# Altium schematic symbol library jlcpcb_2025_04_ferrites_extended_0603.schlib: 833 symbols (part 2 of 4) (continued)
## FBMH1608HM102-T (continued)
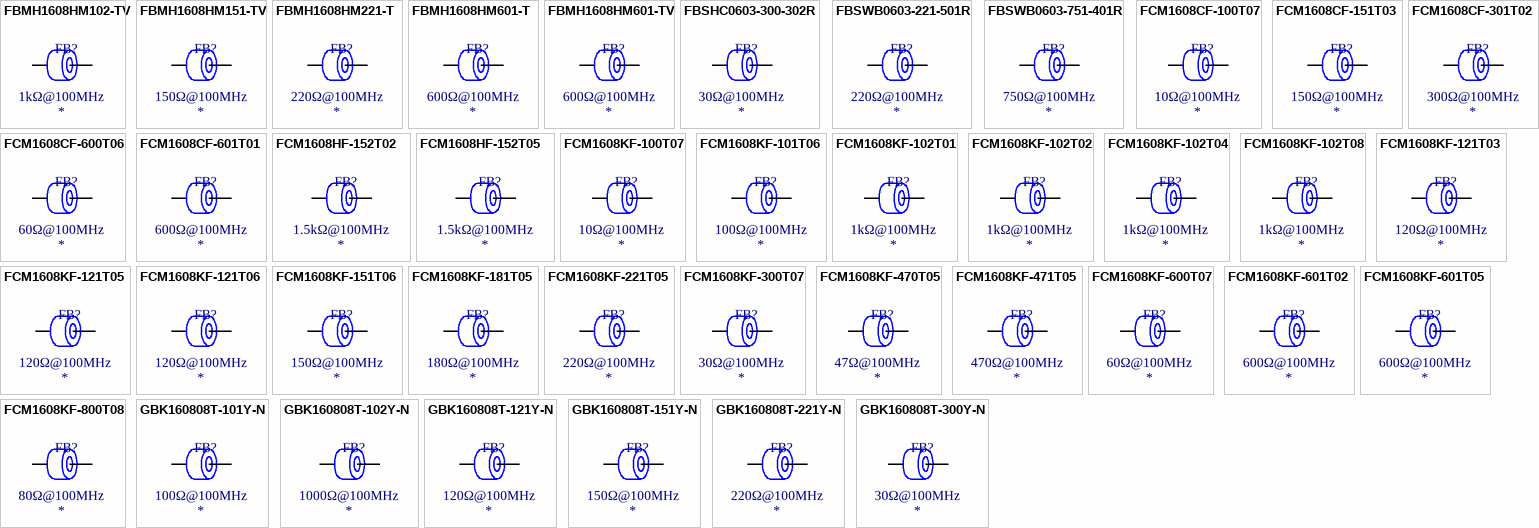
[diagram p9: symbols FBMH1608HM102-TV to GBK160808T-300Y-N]

## FBMH1608HM102-TV
designator FB?  Impedance @ Frequency: 1kΩ@100MHz
Ferrite, 1kΩ@100MHz, ±25%, 350mΩ, 0.6A, SMD 0603; Manufacturer: Taiyo Yuden; Manufacturer Part Number: FBMH1608HM102-TV; Package Size: 0603; JLCPCB Basic Part: No; JLCPCB Part Number: C2661514; Supplier 1: LCSC; Category: Ferrite Beads; Supplier Part Number 1: C2661514; Tolerance: ±25%; Rated Current: 0.6A; DC Resistance: 350mΩ; RoHS: Yes; ComponentLink1Description: Datasheet; ComponentLink1URL: https://wmsc.lcsc.com/wmsc/upload/file/pdf/v2/lcsc/2309051427_Taiyo-Yuden-FBMH1608HM102-TV_C2661514.pdf; ComponentLink2Description: JLCPCB Part URL; ComponentLink2URL: https://jlcpcb.com/partdetail/C2661514; ComponentLink3Description: LCSC Part URL; ComponentLink3URL: https://lcsc.com/product-detail/Ferrite-Beads_Taiyo-Yuden-Taiyo-Yuden-FBMH1608HM102-TV_C2661514.html
footprint FB-0603 (0603 (1608M) Ferrite)
pins: 1, 2

## FBMH1608HM151-TV
designator FB?  Impedance @ Frequency: 150Ω@100MHz
Ferrite, 150Ω@100MHz, ±25%, 50mΩ, 2.1A, SMD 0603; Manufacturer: Taiyo Yuden; Manufacturer Part Number: FBMH1608HM151-TV; Package Size: 0603; JLCPCB Basic Part: No; JLCPCB Part Number: C2661725; Supplier 1: LCSC; Category: Ferrite Beads; Supplier Part Number 1: C2661725; Tolerance: ±25%; Rated Current: 2.1A; DC Resistance: 50mΩ; RoHS: Yes; ComponentLink1Description: Datasheet; ComponentLink1URL: https://wmsc.lcsc.com/wmsc/upload/file/pdf/v2/lcsc/2309051427_Taiyo-Yuden-FBMH1608HM151-TV_C2661725.pdf; ComponentLink2Description: JLCPCB Part URL; ComponentLink2URL: https://jlcpcb.com/partdetail/C2661725; ComponentLink3Description: LCSC Part URL; ComponentLink3URL: https://lcsc.com/product-detail/Ferrite-Beads_Taiyo-Yuden-Taiyo-Yuden-FBMH1608HM151-TV_C2661725.html
footprint FB-0603 (0603 (1608M) Ferrite)
pins: 1, 2

## FBMH1608HM221-T
designator FB?  Impedance @ Frequency: 220Ω@100MHz
Ferrite, 220Ω@100MHz, ±25%, 70mΩ, 1.8A, SMD 0603; Manufacturer: Taiyo Yuden; Manufacturer Part Number: FBMH1608HM221-T; Package Size: 0603; JLCPCB Basic Part: No; JLCPCB Part Number: C515367; Supplier 1: LCSC; Category: Ferrite Beads; Supplier Part Number 1: C515367; Tolerance: ±25%; Rated Current: 1.8A; DC Resistance: 70mΩ; RoHS: Yes; ComponentLink1Description: Datasheet; ComponentLink1URL: https://wmsc.lcsc.com/wmsc/upload/file/pdf/v2/lcsc/2008042203_Taiyo-Yuden-FBMH1608HM221-T_C515367.pdf; ComponentLink2Description: JLCPCB Part URL; ComponentLink2URL: https://jlcpcb.com/partdetail/C515367; ComponentLink3Description: LCSC Part URL; ComponentLink3URL: https://lcsc.com/product-detail/Ferrite-Beads_Taiyo-Yuden-Taiyo-Yuden-FBMH1608HM221-T_C515367.html
footprint FB-0603 (0603 (1608M) Ferrite)
pins: 1, 2

## FBMH1608HM601-T
designator FB?  Impedance @ Frequency: 600Ω@100MHz
Ferrite, 600Ω@100MHz, ±25%, 170mΩ, 900mA, SMD 0603; Manufacturer: Taiyo Yuden; Manufacturer Part Number: FBMH1608HM601-T; Package Size: 0603; JLCPCB Basic Part: No; JLCPCB Part Number: C2650950; Supplier 1: LCSC; Category: Ferrite Beads; Supplier Part Number 1: C2650950; Tolerance: ±25%; Rated Current: 900mA; DC Resistance: 170mΩ; RoHS: Yes; ComponentLink1Description: Datasheet; ComponentLink1URL: https://wmsc.lcsc.com/wmsc/upload/file/pdf/v2/lcsc/2309051352_Taiyo-Yuden-FBMH1608HM601-T_C2650950.pdf; ComponentLink2Description: JLCPCB Part URL; ComponentLink2URL: https://jlcpcb.com/partdetail/C2650950; ComponentLink3Description: LCSC Part URL; ComponentLink3URL: https://lcsc.com/product-detail/Ferrite-Beads_Taiyo-Yuden-Taiyo-Yuden-FBMH1608HM601-T_C2650950.html
footprint FB-0603 (0603 (1608M) Ferrite)
pins: 1, 2

## FBMH1608HM601-TV
designator FB?  Impedance @ Frequency: 600Ω@100MHz
Ferrite, 600Ω@100MHz, ±25%, 170mΩ, 900mA, SMD 0603; Manufacturer: Taiyo Yuden; Manufacturer Part Number: FBMH1608HM601-TV; Package Size: 0603; JLCPCB Basic Part: No; JLCPCB Part Number: C515368; Supplier 1: LCSC; Category: Ferrite Beads; Supplier Part Number 1: C515368; Tolerance: ±25%; Rated Current: 900mA; DC Resistance: 170mΩ; RoHS: Yes; ComponentLink1Description: Datasheet; ComponentLink1URL: https://wmsc.lcsc.com/wmsc/upload/file/pdf/v2/lcsc/2304140030_Taiyo-Yuden-FBMH1608HM601-TV_C515368.pdf; ComponentLink2Description: JLCPCB Part URL; ComponentLink2URL: https://jlcpcb.com/partdetail/C515368; ComponentLink3Description: LCSC Part URL; ComponentLink3URL: https://lcsc.com/product-detail/Ferrite-Beads_Taiyo-Yuden-Taiyo-Yuden-FBMH1608HM601-TV_C515368.html
footprint FB-0603 (0603 (1608M) Ferrite)
pins: 1, 2

## FBSHC0603-300-302R
designator FB?  Impedance @ Frequency: 30Ω@100MHz
Ferrite, 30Ω@100MHz, ±25%, 0.04Ω, 3A, SMD 0603; Manufacturer: KOHERelec; Manufacturer Part Number: FBSHC0603-300-302R; Package Size: 0603; JLCPCB Basic Part: No; JLCPCB Part Number: C2922547; Supplier 1: LCSC; Category: Ferrite Beads; Supplier Part Number 1: C2922547; Tolerance: ±25%; Rated Current: 3A; DC Resistance: 0.04Ω; RoHS: Yes; ComponentLink1Description: Datasheet; ComponentLink1URL: https://wmsc.lcsc.com/wmsc/upload/file/pdf/v2/lcsc/2201121300_KOHERelec-FBSHC0603-300-302R_C2922547.pdf; ComponentLink2Description: JLCPCB Part URL; ComponentLink2URL: https://jlcpcb.com/partdetail/C2922547; ComponentLink3Description: LCSC Part URL; ComponentLink3URL: https://lcsc.com/product-detail/Ferrite-Beads_KOHERelec-KOHERelec-FBSHC0603-300-302R_C2922547.html
footprint FB-0603 (0603 (1608M) Ferrite)
pins: 1, 2

## FBSWB0603-221-501R
designator FB?  Impedance @ Frequency: 220Ω@100MHz
Ferrite, 220Ω@100MHz, ±25%, 170mΩ, 500mA, SMD 0603; Manufacturer: KOHERelec; Manufacturer Part Number: FBSWB0603-221-501R; Package Size: 0603; JLCPCB Basic Part: No; JLCPCB Part Number: C2922551; Supplier 1: LCSC; Category: Ferrite Beads; Supplier Part Number 1: C2922551; Tolerance: ±25%; Rated Current: 500mA; DC Resistance: 170mΩ; RoHS: Yes; ComponentLink1Description: Datasheet; ComponentLink1URL: https://wmsc.lcsc.com/wmsc/upload/file/pdf/v2/lcsc/2201121300_KOHERelec-FBSWB0603-221-501R_C2922551.pdf; ComponentLink2Description: JLCPCB Part URL; ComponentLink2URL: https://jlcpcb.com/partdetail/C2922551; ComponentLink3Description: LCSC Part URL; ComponentLink3URL: https://lcsc.com/product-detail/Ferrite-Beads_KOHERelec-KOHERelec-FBSWB0603-221-501R_C2922551.html
footprint FB-0603 (0603 (1608M) Ferrite)
pins: 1, 2

## FBSWB0603-751-401R
designator FB?  Impedance @ Frequency: 750Ω@100MHz
Ferrite, 750Ω@100MHz, ±25%, 350mΩ, 400mA, SMD 0603; Manufacturer: KOHERelec; Manufacturer Part Number: FBSWB0603-751-401R; Package Size: 0603; JLCPCB Basic Part: No; JLCPCB Part Number: C2922549; Supplier 1: LCSC; Category: Ferrite Beads; Supplier Part Number 1: C2922549; Tolerance: ±25%; Rated Current: 400mA; DC Resistance: 350mΩ; RoHS: Yes; ComponentLink1Description: Datasheet; ComponentLink1URL: https://wmsc.lcsc.com/wmsc/upload/file/pdf/v2/lcsc/2201121300_KOHERelec-FBSWB0603-751-401R_C2922549.pdf; ComponentLink2Description: JLCPCB Part URL; ComponentLink2URL: https://jlcpcb.com/partdetail/C2922549; ComponentLink3Description: LCSC Part URL; ComponentLink3URL: https://lcsc.com/product-detail/Ferrite-Beads_KOHERelec-KOHERelec-FBSWB0603-751-401R_C2922549.html
footprint FB-0603 (0603 (1608M) Ferrite)
pins: 1, 2

## FCM1608CF-100T07
designator FB?  Impedance @ Frequency: 10Ω@100MHz
Ferrite, 10Ω@100MHz, ±25%, 200mΩ, 700mA, SMD 0603; Manufacturer: TAI-TECH; Manufacturer Part Number: FCM1608CF-100T07; Package Size: 0603; JLCPCB Basic Part: No; JLCPCB Part Number: C155053; Supplier 1: LCSC; Category: Ferrite Beads; Supplier Part Number 1: C155053; Tolerance: ±25%; Rated Current: 700mA; DC Resistance: 200mΩ; RoHS: Yes; ComponentLink1Description: Datasheet; ComponentLink1URL: https://wmsc.lcsc.com/wmsc/upload/file/pdf/v2/lcsc/2009171306_TAI-TECH-FCM1608CF-100T07_C155053.pdf; ComponentLink2Description: JLCPCB Part URL; ComponentLink2URL: https://jlcpcb.com/partdetail/C155053; ComponentLink3Description: LCSC Part URL; ComponentLink3URL: https://lcsc.com/product-detail/Ferrite-Beads_TAI-TECH-TAI-TECH-FCM1608CF-100T07_C155053.html
footprint FB-0603 (0603 (1608M) Ferrite)
pins: 1, 2

## FCM1608CF-151T03
designator FB?  Impedance @ Frequency: 150Ω@100MHz
Ferrite, 150Ω@100MHz, ±25%, 300mA, SMD 0603; Manufacturer: TAI-TECH; Manufacturer Part Number: FCM1608CF-151T03; Package Size: 0603; JLCPCB Basic Part: No; JLCPCB Part Number: C155055; Supplier 1: LCSC; Category: Ferrite Beads; Supplier Part Number 1: C155055; Tolerance: ±25%; Rated Current: 300mA; RoHS: Yes; ComponentLink1Description: Datasheet; ComponentLink1URL: https://wmsc.lcsc.com/wmsc/upload/file/pdf/v2/lcsc/2009171306_TAI-TECH-FCM1608CF-151T03_C155055.pdf; ComponentLink2Description: JLCPCB Part URL; ComponentLink2URL: https://jlcpcb.com/partdetail/C155055; ComponentLink3Description: LCSC Part URL; ComponentLink3URL: https://lcsc.com/product-detail/Ferrite-Beads_TAI-TECH-TAI-TECH-FCM1608CF-151T03_C155055.html
pins: 1, 2

## FCM1608CF-301T02
designator FB?  Impedance @ Frequency: 300Ω@100MHz
Ferrite, 300Ω@100MHz, ±25%, 800mΩ, 200mA, SMD 0603; Manufacturer: TAI-TECH; Manufacturer Part Number: FCM1608CF-301T02; Package Size: 0603; JLCPCB Basic Part: No; JLCPCB Part Number: C155058; Supplier 1: LCSC; Category: Ferrite Beads; Supplier Part Number 1: C155058; Tolerance: ±25%; Rated Current: 200mA; DC Resistance: 800mΩ; RoHS: Yes; ComponentLink1Description: Datasheet; ComponentLink1URL: https://wmsc.lcsc.com/wmsc/upload/file/pdf/v2/lcsc/2009171306_TAI-TECH-FCM1608CF-301T02_C155058.pdf; ComponentLink2Description: JLCPCB Part URL; ComponentLink2URL: https://jlcpcb.com/partdetail/C155058; ComponentLink3Description: LCSC Part URL; ComponentLink3URL: https://lcsc.com/product-detail/Ferrite-Beads_TAI-TECH-TAI-TECH-FCM1608CF-301T02_C155058.html
footprint FB-0603 (0603 (1608M) Ferrite)
pins: 1, 2

## FCM1608CF-600T06
designator FB?  Impedance @ Frequency: 60Ω@100MHz
Ferrite, 60Ω@100MHz, ±25%, 300mΩ, 600mA, SMD 0603; Manufacturer: TAI-TECH; Manufacturer Part Number: FCM1608CF-600T06; Package Size: 0603; JLCPCB Basic Part: No; JLCPCB Part Number: C155060; Supplier 1: LCSC; Category: Ferrite Beads; Supplier Part Number 1: C155060; Tolerance: ±25%; Rated Current: 600mA; DC Resistance: 300mΩ; RoHS: Yes; ComponentLink1Description: Datasheet; ComponentLink1URL: https://wmsc.lcsc.com/wmsc/upload/file/pdf/v2/lcsc/2009171306_TAI-TECH-FCM1608CF-600T06_C155060.pdf; ComponentLink2Description: JLCPCB Part URL; ComponentLink2URL: https://jlcpcb.com/partdetail/C155060; ComponentLink3Description: LCSC Part URL; ComponentLink3URL: https://lcsc.com/product-detail/Ferrite-Beads_TAI-TECH-TAI-TECH-FCM1608CF-600T06_C155060.html
footprint FB-0603 (0603 (1608M) Ferrite)
pins: 1, 2

## FCM1608CF-601T01
designator FB?  Impedance @ Frequency: 600Ω@100MHz
Ferrite, 600Ω@100MHz, ±25%, 1.2Ω, 150mA, SMD 0603; Manufacturer: TAI-TECH; Manufacturer Part Number: FCM1608CF-601T01; Package Size: 0603; JLCPCB Basic Part: No; JLCPCB Part Number: C155061; Supplier 1: LCSC; Category: Ferrite Beads; Supplier Part Number 1: C155061; Tolerance: ±25%; Rated Current: 150mA; DC Resistance: 1.2Ω; RoHS: Yes; ComponentLink1Description: Datasheet; ComponentLink1URL: https://wmsc.lcsc.com/wmsc/upload/file/pdf/v2/lcsc/2009171306_TAI-TECH-FCM1608CF-601T01_C155061.pdf; ComponentLink2Description: JLCPCB Part URL; ComponentLink2URL: https://jlcpcb.com/partdetail/C155061; ComponentLink3Description: LCSC Part URL; ComponentLink3URL: https://lcsc.com/product-detail/Ferrite-Beads_TAI-TECH-TAI-TECH-FCM1608CF-601T01_C155061.html
footprint FB-0603 (0603 (1608M) Ferrite)
pins: 1, 2

## FCM1608HF-152T02
designator FB?  Impedance @ Frequency: 1.5kΩ@100MHz
Ferrite, 1.5kΩ@100MHz, ±25%, 1Ω, 200mA, SMD 0603; Manufacturer: TAI-TECH; Manufacturer Part Number: FCM1608HF-152T02; Package Size: 0603; JLCPCB Basic Part: No; JLCPCB Part Number: C155062; Supplier 1: LCSC; Category: Ferrite Beads; Supplier Part Number 1: C155062; Tolerance: ±25%; Rated Current: 200mA; DC Resistance: 1Ω; RoHS: Yes; ComponentLink1Description: Datasheet; ComponentLink1URL: https://wmsc.lcsc.com/wmsc/upload/file/pdf/v2/lcsc/2009171306_TAI-TECH-FCM1608HF-152T02_C155062.pdf; ComponentLink2Description: JLCPCB Part URL; ComponentLink2URL: https://jlcpcb.com/partdetail/C155062; ComponentLink3Description: LCSC Part URL; ComponentLink3URL: https://lcsc.com/product-detail/Ferrite-Beads_TAI-TECH-TAI-TECH-FCM1608HF-152T02_C155062.html
footprint FB-0603 (0603 (1608M) Ferrite)
pins: 1, 2

## FCM1608HF-152T05
designator FB?  Impedance @ Frequency: 1.5kΩ@100MHz
Ferrite, 1.5kΩ@100MHz, ±25%, 1Ω, 500mA, SMD 0603; Manufacturer: TAI-TECH; Manufacturer Part Number: FCM1608HF-152T05; Package Size: 0603; JLCPCB Basic Part: No; JLCPCB Part Number: C304247; Supplier 1: LCSC; Category: Ferrite Beads; Supplier Part Number 1: C304247; Tolerance: ±25%; Rated Current: 500mA; DC Resistance: 1Ω; RoHS: Yes; ComponentLink1Description: Datasheet; ComponentLink1URL: https://wmsc.lcsc.com/wmsc/upload/file/pdf/v2/lcsc/2009171410_TAI-TECH-FCM1608HF-152T05_C304247.pdf; ComponentLink2Description: JLCPCB Part URL; ComponentLink2URL: https://jlcpcb.com/partdetail/C304247; ComponentLink3Description: LCSC Part URL; ComponentLink3URL: https://lcsc.com/product-detail/Ferrite-Beads_TAI-TECH-TAI-TECH-FCM1608HF-152T05_C304247.html
footprint FB-0603 (0603 (1608M) Ferrite)
pins: 1, 2

## FCM1608KF-100T07
designator FB?  Impedance @ Frequency: 10Ω@100MHz
Ferrite, 10Ω@100MHz, ±25%, 200mΩ, 700mA, SMD 0603; Manufacturer: TAI-TECH; Manufacturer Part Number: FCM1608KF-100T07; Package Size: 0603; JLCPCB Basic Part: No; JLCPCB Part Number: C369538; Supplier 1: LCSC; Category: Ferrite Beads; Supplier Part Number 1: C369538; Tolerance: ±25%; Rated Current: 700mA; DC Resistance: 200mΩ; RoHS: Yes; ComponentLink1Description: Datasheet; ComponentLink1URL: https://wmsc.lcsc.com/wmsc/upload/file/pdf/v2/lcsc/2009171441_TAI-TECH-FCM1608KF-100T07_C369538.pdf; ComponentLink2Description: JLCPCB Part URL; ComponentLink2URL: https://jlcpcb.com/partdetail/C369538; ComponentLink3Description: LCSC Part URL; ComponentLink3URL: https://lcsc.com/product-detail/Ferrite-Beads_TAI-TECH-TAI-TECH-FCM1608KF-100T07_C369538.html
footprint FB-0603 (0603 (1608M) Ferrite)
pins: 1, 2

## FCM1608KF-101T06
designator FB?  Impedance @ Frequency: 100Ω@100MHz
Ferrite, 100Ω@100MHz, ±25%, 250mΩ, 600mA, SMD 0603; Manufacturer: TAI-TECH; Manufacturer Part Number: FCM1608KF-101T06; Package Size: 0603; JLCPCB Basic Part: No; JLCPCB Part Number: C369539; Supplier 1: LCSC; Category: Ferrite Beads; Supplier Part Number 1: C369539; Tolerance: ±25%; Rated Current: 600mA; DC Resistance: 250mΩ; RoHS: Yes; ComponentLink1Description: Datasheet; ComponentLink1URL: https://wmsc.lcsc.com/wmsc/upload/file/pdf/v2/lcsc/2009171441_TAI-TECH-FCM1608KF-101T06_C369539.pdf; ComponentLink2Description: JLCPCB Part URL; ComponentLink2URL: https://jlcpcb.com/partdetail/C369539; ComponentLink3Description: LCSC Part URL; ComponentLink3URL: https://lcsc.com/product-detail/Ferrite-Beads_TAI-TECH-TAI-TECH-FCM1608KF-101T06_C369539.html
footprint FB-0603 (0603 (1608M) Ferrite)
pins: 1, 2

## FCM1608KF-102T01
designator FB?  Impedance @ Frequency: 1kΩ@100MHz
Ferrite, 1kΩ@100MHz, ±25%, 700mΩ, 100mA, SMD 0603; Manufacturer: TAI-TECH; Manufacturer Part Number: FCM1608KF-102T01; Package Size: 0603; JLCPCB Basic Part: No; JLCPCB Part Number: C525669; Supplier 1: LCSC; Category: Ferrite Beads; Supplier Part Number 1: C525669; Tolerance: ±25%; Rated Current: 100mA; DC Resistance: 700mΩ; RoHS: Yes; ComponentLink1Description: Datasheet; ComponentLink1URL: https://wmsc.lcsc.com/wmsc/upload/file/pdf/v2/lcsc/2009171442_TAI-TECH-FCM1608KF-102T01_C525669.pdf; ComponentLink2Description: JLCPCB Part URL; ComponentLink2URL: https://jlcpcb.com/partdetail/C525669; ComponentLink3Description: LCSC Part URL; ComponentLink3URL: https://lcsc.com/product-detail/Ferrite-Beads_TAI-TECH-TAI-TECH-FCM1608KF-102T01_C525669.html
footprint FB-0603 (0603 (1608M) Ferrite)
pins: 1, 2

## FCM1608KF-102T02
designator FB?  Impedance @ Frequency: 1kΩ@100MHz
Ferrite, 1kΩ@100MHz, ±25%, 700mΩ, 200mA, SMD 0603; Manufacturer: TAI-TECH; Manufacturer Part Number: FCM1608KF-102T02; Package Size: 0603; JLCPCB Basic Part: No; JLCPCB Part Number: C127293; Supplier 1: LCSC; Category: Ferrite Beads; Supplier Part Number 1: C127293; Tolerance: ±25%; Rated Current: 200mA; DC Resistance: 700mΩ; RoHS: Yes; ComponentLink1Description: Datasheet; ComponentLink1URL: https://wmsc.lcsc.com/wmsc/upload/file/pdf/v2/lcsc/2009171134_TAI-TECH-FCM1608KF-102T02_C127293.pdf; ComponentLink2Description: JLCPCB Part URL; ComponentLink2URL: https://jlcpcb.com/partdetail/C127293; ComponentLink3Description: LCSC Part URL; ComponentLink3URL: https://lcsc.com/product-detail/Ferrite-Beads_TAI-TECH-TAI-TECH-FCM1608KF-102T02_C127293.html
footprint FB-0603 (0603 (1608M) Ferrite)
pins: 1, 2

## FCM1608KF-102T04
designator FB?  Impedance @ Frequency: 1kΩ@100MHz
Ferrite, 1kΩ@100MHz, ±25%, 700mΩ, 400mA, SMD 0603; Manufacturer: TAI-TECH; Manufacturer Part Number: FCM1608KF-102T04; Package Size: 0603; JLCPCB Basic Part: No; JLCPCB Part Number: C369540; Supplier 1: LCSC; Category: Ferrite Beads; Supplier Part Number 1: C369540; Tolerance: ±25%; Rated Current: 400mA; DC Resistance: 700mΩ; RoHS: Yes; ComponentLink1Description: Datasheet; ComponentLink1URL: https://wmsc.lcsc.com/wmsc/upload/file/pdf/v2/lcsc/2009171442_TAI-TECH-FCM1608KF-102T04_C369540.pdf; ComponentLink2Description: JLCPCB Part URL; ComponentLink2URL: https://jlcpcb.com/partdetail/C369540; ComponentLink3Description: LCSC Part URL; ComponentLink3URL: https://lcsc.com/product-detail/Ferrite-Beads_TAI-TECH-TAI-TECH-FCM1608KF-102T04_C369540.html
footprint FB-0603 (0603 (1608M) Ferrite)
pins: 1, 2

## FCM1608KF-102T08
designator FB?  Impedance @ Frequency: 1kΩ@100MHz
Ferrite, 1kΩ@100MHz, ±25%, 700mΩ, 800mA, SMD 0603; Manufacturer: TAI-TECH; Manufacturer Part Number: FCM1608KF-102T08; Package Size: 0603; JLCPCB Basic Part: No; JLCPCB Part Number: C2880084; Supplier 1: LCSC; Category: Ferrite Beads; Supplier Part Number 1: C2880084; Tolerance: ±25%; Rated Current: 800mA; DC Resistance: 700mΩ; RoHS: Yes; ComponentLink1Description: Datasheet; ComponentLink1URL: https://wmsc.lcsc.com/wmsc/upload/file/pdf/v2/lcsc/2108241130_TAI-TECH-FCM1608KF-102T08_C2880084.pdf; ComponentLink2Description: JLCPCB Part URL; ComponentLink2URL: https://jlcpcb.com/partdetail/C2880084; ComponentLink3Description: LCSC Part URL; ComponentLink3URL: https://lcsc.com/product-detail/Ferrite-Beads_TAI-TECH-TAI-TECH-FCM1608KF-102T08_C2880084.html
footprint FB-0603 (0603 (1608M) Ferrite)
pins: 1, 2

## FCM1608KF-121T03
designator FB?  Impedance @ Frequency: 120Ω@100MHz
Ferrite, 120Ω@100MHz, ±25%, 250mΩ, 300mA, SMD 0603; Manufacturer: TAI-TECH; Manufacturer Part Number: FCM1608KF-121T03; Package Size: 0603; JLCPCB Basic Part: No; JLCPCB Part Number: C127288; Supplier 1: LCSC; Category: Ferrite Beads; Supplier Part Number 1: C127288; Tolerance: ±25%; Rated Current: 300mA; DC Resistance: 250mΩ; RoHS: Yes; ComponentLink1Description: Datasheet; ComponentLink1URL: https://wmsc.lcsc.com/wmsc/upload/file/pdf/v2/lcsc/2009171134_TAI-TECH-FCM1608KF-121T03_C127288.pdf; ComponentLink2Description: JLCPCB Part URL; ComponentLink2URL: https://jlcpcb.com/partdetail/C127288; ComponentLink3Description: LCSC Part URL; ComponentLink3URL: https://lcsc.com/product-detail/Ferrite-Beads_TAI-TECH-TAI-TECH-FCM1608KF-121T03_C127288.html
footprint FB-0603 (0603 (1608M) Ferrite)
pins: 1, 2

## FCM1608KF-121T05
designator FB?  Impedance @ Frequency: 120Ω@100MHz
Ferrite, 120Ω@100MHz, ±25%, 250mΩ, 500mA, SMD 0603; Manufacturer: TAI-TECH; Manufacturer Part Number: FCM1608KF-121T05; Package Size: 0603; JLCPCB Basic Part: No; JLCPCB Part Number: C133933; Supplier 1: LCSC; Category: Ferrite Beads; Supplier Part Number 1: C133933; Tolerance: ±25%; Rated Current: 500mA; DC Resistance: 250mΩ; RoHS: Yes; ComponentLink1Description: Datasheet; ComponentLink1URL: https://wmsc.lcsc.com/wmsc/upload/file/pdf/v2/lcsc/2009171304_TAI-TECH-FCM1608KF-121T05_C133933.pdf; ComponentLink2Description: JLCPCB Part URL; ComponentLink2URL: https://jlcpcb.com/partdetail/C133933; ComponentLink3Description: LCSC Part URL; ComponentLink3URL: https://lcsc.com/product-detail/Ferrite-Beads_TAI-TECH-TAI-TECH-FCM1608KF-121T05_C133933.html
footprint FB-0603 (0603 (1608M) Ferrite)
pins: 1, 2

## FCM1608KF-121T06
designator FB?  Impedance @ Frequency: 120Ω@100MHz
Ferrite, 120Ω@100MHz, ±25%, 250mΩ, 600mA, SMD 0603; Manufacturer: TAI-TECH; Manufacturer Part Number: FCM1608KF-121T06; Package Size: 0603; JLCPCB Basic Part: No; JLCPCB Part Number: C155064; Supplier 1: LCSC; Category: Ferrite Beads; Supplier Part Number 1: C155064; Tolerance: ±25%; Rated Current: 600mA; DC Resistance: 250mΩ; RoHS: Yes; ComponentLink1Description: Datasheet; ComponentLink1URL: https://wmsc.lcsc.com/wmsc/upload/file/pdf/v2/lcsc/2009171306_TAI-TECH-FCM1608KF-121T06_C155064.pdf; ComponentLink2Description: JLCPCB Part URL; ComponentLink2URL: https://jlcpcb.com/partdetail/C155064; ComponentLink3Description: LCSC Part URL; ComponentLink3URL: https://lcsc.com/product-detail/Ferrite-Beads_TAI-TECH-TAI-TECH-FCM1608KF-121T06_C155064.html
footprint FB-0603 (0603 (1608M) Ferrite)
pins: 1, 2

## FCM1608KF-151T06
designator FB?  Impedance @ Frequency: 150Ω@100MHz
Ferrite, 150Ω@100MHz, ±25%, 250mΩ, 600mA, SMD 0603; Manufacturer: TAI-TECH; Manufacturer Part Number: FCM1608KF-151T06; Package Size: 0603; JLCPCB Basic Part: No; JLCPCB Part Number: C155065; Supplier 1: LCSC; Category: Ferrite Beads; Supplier Part Number 1: C155065; Tolerance: ±25%; Rated Current: 600mA; DC Resistance: 250mΩ; RoHS: Yes; ComponentLink1Description: Datasheet; ComponentLink1URL: https://wmsc.lcsc.com/wmsc/upload/file/pdf/v2/lcsc/2009171306_TAI-TECH-FCM1608KF-151T06_C155065.pdf; ComponentLink2Description: JLCPCB Part URL; ComponentLink2URL: https://jlcpcb.com/partdetail/C155065; ComponentLink3Description: LCSC Part URL; ComponentLink3URL: https://lcsc.com/product-detail/Ferrite-Beads_TAI-TECH-TAI-TECH-FCM1608KF-151T06_C155065.html
footprint FB-0603 (0603 (1608M) Ferrite)
pins: 1, 2

## FCM1608KF-181T05
designator FB?  Impedance @ Frequency: 180Ω@100MHz
Ferrite, 180Ω@100MHz, ±25%, 500mA, SMD 0603; Manufacturer: TAI-TECH; Manufacturer Part Number: FCM1608KF-181T05; Package Size: 0603; JLCPCB Basic Part: No; JLCPCB Part Number: C304248; Supplier 1: LCSC; Category: Ferrite Beads; Supplier Part Number 1: C304248; Tolerance: ±25%; Rated Current: 500mA; RoHS: Yes; ComponentLink1Description: Datasheet; ComponentLink1URL: https://wmsc.lcsc.com/wmsc/upload/file/pdf/v2/lcsc/2009171410_TAI-TECH-FCM1608KF-181T05_C304248.pdf; ComponentLink2Description: JLCPCB Part URL; ComponentLink2URL: https://jlcpcb.com/partdetail/C304248; ComponentLink3Description: LCSC Part URL; ComponentLink3URL: https://lcsc.com/product-detail/Ferrite-Beads_TAI-TECH-TAI-TECH-FCM1608KF-181T05_C304248.html
pins: 1, 2

## FCM1608KF-221T05
designator FB?  Impedance @ Frequency: 220Ω@100MHz
Ferrite, 220Ω@100MHz, ±25%, 300mΩ, 550mA, SMD 0603; Manufacturer: TAI-TECH; Manufacturer Part Number: FCM1608KF-221T05; Package Size: 0603; JLCPCB Basic Part: No; JLCPCB Part Number: C133934; Supplier 1: LCSC; Category: Ferrite Beads; Supplier Part Number 1: C133934; Tolerance: ±25%; Rated Current: 550mA; DC Resistance: 300mΩ; RoHS: Yes; ComponentLink1Description: Datasheet; ComponentLink1URL: https://wmsc.lcsc.com/wmsc/upload/file/pdf/v2/lcsc/2009171304_TAI-TECH-FCM1608KF-221T05_C133934.pdf; ComponentLink2Description: JLCPCB Part URL; ComponentLink2URL: https://jlcpcb.com/partdetail/C133934; ComponentLink3Description: LCSC Part URL; ComponentLink3URL: https://lcsc.com/product-detail/Ferrite-Beads_TAI-TECH-TAI-TECH-FCM1608KF-221T05_C133934.html
footprint FB-0603 (0603 (1608M) Ferrite)
pins: 1, 2

## FCM1608KF-300T07
designator FB?  Impedance @ Frequency: 30Ω@100MHz
Ferrite, 30Ω@100MHz, ±25%, 200mΩ, 700mA, SMD 0603; Manufacturer: TAI-TECH; Manufacturer Part Number: FCM1608KF-300T07; Package Size: 0603; JLCPCB Basic Part: No; JLCPCB Part Number: C133930; Supplier 1: LCSC; Category: Ferrite Beads; Supplier Part Number 1: C133930; Tolerance: ±25%; Rated Current: 700mA; DC Resistance: 200mΩ; RoHS: Yes; ComponentLink1Description: Datasheet; ComponentLink1URL: https://wmsc.lcsc.com/wmsc/upload/file/pdf/v2/lcsc/2009171304_TAI-TECH-FCM1608KF-300T07_C133930.pdf; ComponentLink2Description: JLCPCB Part URL; ComponentLink2URL: https://jlcpcb.com/partdetail/C133930; ComponentLink3Description: LCSC Part URL; ComponentLink3URL: https://lcsc.com/product-detail/Ferrite-Beads_TAI-TECH-TAI-TECH-FCM1608KF-300T07_C133930.html
footprint FB-0603 (0603 (1608M) Ferrite)
pins: 1, 2

## FCM1608KF-470T05
designator FB?  Impedance @ Frequency: 47Ω@100MHz
Ferrite, 47Ω@100MHz, ±25%, 200mΩ, 500mA, SMD 0603; Manufacturer: TAI-TECH; Manufacturer Part Number: FCM1608KF-470T05; Package Size: 0603; JLCPCB Basic Part: No; JLCPCB Part Number: C304249; Supplier 1: LCSC; Category: Ferrite Beads; Supplier Part Number 1: C304249; Tolerance: ±25%; Rated Current: 500mA; DC Resistance: 200mΩ; RoHS: Yes; ComponentLink1Description: Datasheet; ComponentLink1URL: https://wmsc.lcsc.com/wmsc/upload/file/pdf/v2/lcsc/2009171410_TAI-TECH-FCM1608KF-470T05_C304249.pdf; ComponentLink2Description: JLCPCB Part URL; ComponentLink2URL: https://jlcpcb.com/partdetail/C304249; ComponentLink3Description: LCSC Part URL; ComponentLink3URL: https://lcsc.com/product-detail/Ferrite-Beads_TAI-TECH-TAI-TECH-FCM1608KF-470T05_C304249.html
footprint FB-0603 (0603 (1608M) Ferrite)
pins: 1, 2

## FCM1608KF-471T05
designator FB?  Impedance @ Frequency: 470Ω@100MHz
Ferrite, 470Ω@100MHz, ±25%, 450mΩ, 500mA, SMD 0603; Manufacturer: TAI-TECH; Manufacturer Part Number: FCM1608KF-471T05; Package Size: 0603; JLCPCB Basic Part: No; JLCPCB Part Number: C133936; Supplier 1: LCSC; Category: Ferrite Beads; Supplier Part Number 1: C133936; Tolerance: ±25%; Rated Current: 500mA; DC Resistance: 450mΩ; RoHS: Yes; ComponentLink1Description: Datasheet; ComponentLink1URL: https://wmsc.lcsc.com/wmsc/upload/file/pdf/v2/lcsc/2009171304_TAI-TECH-FCM1608KF-471T05_C133936.pdf; ComponentLink2Description: JLCPCB Part URL; ComponentLink2URL: https://jlcpcb.com/partdetail/C133936; ComponentLink3Description: LCSC Part URL; ComponentLink3URL: https://lcsc.com/product-detail/Ferrite-Beads_TAI-TECH-TAI-TECH-FCM1608KF-471T05_C133936.html
footprint FB-0603 (0603 (1608M) Ferrite)
pins: 1, 2

## FCM1608KF-600T07
designator FB?  Impedance @ Frequency: 60Ω@100MHz
Ferrite, 60Ω@100MHz, ±25%, 200mΩ, 700mA, SMD 0603; Manufacturer: TAI-TECH; Manufacturer Part Number: FCM1608KF-600T07; Package Size: 0603; JLCPCB Basic Part: No; JLCPCB Part Number: C133931; Supplier 1: LCSC; Category: Ferrite Beads; Supplier Part Number 1: C133931; Tolerance: ±25%; Rated Current: 700mA; DC Resistance: 200mΩ; RoHS: Yes; ComponentLink1Description: Datasheet; ComponentLink1URL: https://wmsc.lcsc.com/wmsc/upload/file/pdf/v2/lcsc/2009171304_TAI-TECH-FCM1608KF-600T07_C133931.pdf; ComponentLink2Description: JLCPCB Part URL; ComponentLink2URL: https://jlcpcb.com/partdetail/C133931; ComponentLink3Description: LCSC Part URL; ComponentLink3URL: https://lcsc.com/product-detail/Ferrite-Beads_TAI-TECH-TAI-TECH-FCM1608KF-600T07_C133931.html
footprint FB-0603 (0603 (1608M) Ferrite)
pins: 1, 2

## FCM1608KF-601T02
designator FB?  Impedance @ Frequency: 600Ω@100MHz
Ferrite, 600Ω@100MHz, ±25%, 500mΩ, 200mA, SMD 0603; Manufacturer: TAI-TECH; Manufacturer Part Number: FCM1608KF-601T02; Package Size: 0603; JLCPCB Basic Part: No; JLCPCB Part Number: C127281; Supplier 1: LCSC; Category: Ferrite Beads; Supplier Part Number 1: C127281; Tolerance: ±25%; Rated Current: 200mA; DC Resistance: 500mΩ; RoHS: Yes; ComponentLink1Description: Datasheet; ComponentLink1URL: https://wmsc.lcsc.com/wmsc/upload/file/pdf/v2/lcsc/2009171134_TAI-TECH-FCM1608KF-601T02_C127281.pdf; ComponentLink2Description: JLCPCB Part URL; ComponentLink2URL: https://jlcpcb.com/partdetail/C127281; ComponentLink3Description: LCSC Part URL; ComponentLink3URL: https://lcsc.com/product-detail/Ferrite-Beads_TAI-TECH-TAI-TECH-FCM1608KF-601T02_C127281.html
footprint FB-0603 (0603 (1608M) Ferrite)
pins: 1, 2

## FCM1608KF-601T05
designator FB?  Impedance @ Frequency: 600Ω@100MHz
Ferrite, 600Ω@100MHz, ±25%, 500mΩ, 500mA, SMD 0603; Manufacturer: TAI-TECH; Manufacturer Part Number: FCM1608KF-601T05; Package Size: 0603; JLCPCB Basic Part: No; JLCPCB Part Number: C133937; Supplier 1: LCSC; Category: Ferrite Beads; Supplier Part Number 1: C133937; Tolerance: ±25%; Rated Current: 500mA; DC Resistance: 500mΩ; RoHS: Yes; ComponentLink1Description: Datasheet; ComponentLink1URL: https://wmsc.lcsc.com/wmsc/upload/file/pdf/v2/lcsc/2009171304_TAI-TECH-FCM1608KF-601T05_C133937.pdf; ComponentLink2Description: JLCPCB Part URL; ComponentLink2URL: https://jlcpcb.com/partdetail/C133937; ComponentLink3Description: LCSC Part URL; ComponentLink3URL: https://lcsc.com/product-detail/Ferrite-Beads_TAI-TECH-TAI-TECH-FCM1608KF-601T05_C133937.html
footprint FB-0603 (0603 (1608M) Ferrite)
pins: 1, 2

## FCM1608KF-800T08
designator FB?  Impedance @ Frequency: 80Ω@100MHz
Ferrite, 80Ω@100MHz, ±25%, 200mΩ, 800mA, SMD 0603; Manufacturer: TAI-TECH; Manufacturer Part Number: FCM1608KF-800T08; Package Size: 0603; JLCPCB Basic Part: No; JLCPCB Part Number: C369541; Supplier 1: LCSC; Category: Ferrite Beads; Supplier Part Number 1: C369541; Tolerance: ±25%; Rated Current: 800mA; DC Resistance: 200mΩ; RoHS: Yes; ComponentLink1Description: Datasheet; ComponentLink1URL: https://wmsc.lcsc.com/wmsc/upload/file/pdf/v2/lcsc/2009171442_TAI-TECH-FCM1608KF-800T08_C369541.pdf; ComponentLink2Description: JLCPCB Part URL; ComponentLink2URL: https://jlcpcb.com/partdetail/C369541; ComponentLink3Description: LCSC Part URL; ComponentLink3URL: https://lcsc.com/product-detail/Ferrite-Beads_TAI-TECH-TAI-TECH-FCM1608KF-800T08_C369541.html
footprint FB-0603 (0603 (1608M) Ferrite)
pins: 1, 2

## GBK160808T-101Y-N
designator FB?  Impedance @ Frequency: 100Ω@100MHz
Ferrite, 100Ω@100MHz, ±25%, 0.15Ω, 600mA, SMD 0603; Manufacturer: Chilisin Elec; Manufacturer Part Number: GBK160808T-101Y-N; Package Size: 0603; JLCPCB Basic Part: No; JLCPCB Part Number: C285932; Supplier 1: LCSC; Category: Ferrite Beads; Supplier Part Number 1: C285932; Tolerance: ±25%; Rated Current: 600mA; DC Resistance: 0.15Ω; RoHS: Yes; ComponentLink1Description: Datasheet; ComponentLink1URL: https://wmsc.lcsc.com/wmsc/upload/file/pdf/v2/lcsc/1810301826_Chilisin-Elec-GBK160808T-101Y-N_C285932.pdf; ComponentLink2Description: JLCPCB Part URL; ComponentLink2URL: https://jlcpcb.com/partdetail/C285932; ComponentLink3Description: LCSC Part URL; ComponentLink3URL: https://lcsc.com/product-detail/Ferrite-Beads_Chilisin-Elec-Chilisin-Elec-GBK160808T-101Y-N_C285932.html
footprint FB-0603 (0603 (1608M) Ferrite)
pins: 1, 2

## GBK160808T-102Y-N
designator FB?  Impedance @ Frequency: 1000Ω@100MHz
Ferrite, 1000Ω@100MHz, ±25%, 0.45Ω, 300mA, SMD 0603; Manufacturer: Chilisin Elec; Manufacturer Part Number: GBK160808T-102Y-N; Package Size: 0603; JLCPCB Basic Part: No; JLCPCB Part Number: C285931; Supplier 1: LCSC; Category: Ferrite Beads; Supplier Part Number 1: C285931; Tolerance: ±25%; Rated Current: 300mA; DC Resistance: 0.45Ω; RoHS: Yes; ComponentLink1Description: Datasheet; ComponentLink1URL: https://wmsc.lcsc.com/wmsc/upload/file/pdf/v2/lcsc/2304140030_Chilisin-Elec-GBK160808T-102Y-N_C285931.pdf; ComponentLink2Description: JLCPCB Part URL; ComponentLink2URL: https://jlcpcb.com/partdetail/C285931; ComponentLink3Description: LCSC Part URL; ComponentLink3URL: https://lcsc.com/product-detail/Ferrite-Beads_Chilisin-Elec-Chilisin-Elec-GBK160808T-102Y-N_C285931.html
footprint FB-0603 (0603 (1608M) Ferrite)
pins: 1, 2

## GBK160808T-121Y-N
designator FB?  Impedance @ Frequency: 120Ω@100MHz
Ferrite, 120Ω@100MHz, ±25%, 0.15Ω, 600mA, SMD 0603; Manufacturer: Chilisin Elec; Manufacturer Part Number: GBK160808T-121Y-N; Package Size: 0603; JLCPCB Basic Part: No; JLCPCB Part Number: C280478; Supplier 1: LCSC; Category: Ferrite Beads; Supplier Part Number 1: C280478; Tolerance: ±25%; Rated Current: 600mA; DC Resistance: 0.15Ω; RoHS: Yes; ComponentLink1Description: Datasheet; ComponentLink1URL: https://wmsc.lcsc.com/wmsc/upload/file/pdf/v2/lcsc/2304140030_Chilisin-Elec-GBK160808T-121Y-N_C280478.pdf; ComponentLink2Description: JLCPCB Part URL; ComponentLink2URL: https://jlcpcb.com/partdetail/C280478; ComponentLink3Description: LCSC Part URL; ComponentLink3URL: https://lcsc.com/product-detail/Ferrite-Beads_Chilisin-Elec-Chilisin-Elec-GBK160808T-121Y-N_C280478.html
footprint FB-0603 (0603 (1608M) Ferrite)
pins: 1, 2

## GBK160808T-151Y-N
designator FB?  Impedance @ Frequency: 150Ω@100MHz
Ferrite, 150Ω@100MHz, SMD 0603; Manufacturer: Chilisin Elec; Manufacturer Part Number: GBK160808T-151Y-N; Package Size: 0603; JLCPCB Basic Part: No; JLCPCB Part Number: C285930; Supplier 1: LCSC; Category: Ferrite Beads; Supplier Part Number 1: C285930; RoHS: Yes; ComponentLink1Description: Datasheet; ComponentLink2Description: JLCPCB Part URL; ComponentLink2URL: https://jlcpcb.com/partdetail/C285930; ComponentLink3Description: LCSC Part URL; ComponentLink3URL: https://lcsc.com/product-detail/Ferrite-Beads_Chilisin-Elec-Chilisin-Elec-GBK160808T-151Y-N_C285930.html
pins: 1, 2

## GBK160808T-221Y-N
designator FB?  Impedance @ Frequency: 220Ω@100MHz
Ferrite, 220Ω@100MHz, ±25%, 0.18Ω, 550mA, SMD 0603; Manufacturer: Chilisin Elec; Manufacturer Part Number: GBK160808T-221Y-N; Package Size: 0603; JLCPCB Basic Part: No; JLCPCB Part Number: C280479; Supplier 1: LCSC; Category: Ferrite Beads; Supplier Part Number 1: C280479; Tolerance: ±25%; Rated Current: 550mA; DC Resistance: 0.18Ω; RoHS: Yes; ComponentLink1Description: Datasheet; ComponentLink1URL: https://wmsc.lcsc.com/wmsc/upload/file/pdf/v2/lcsc/2304140030_Chilisin-Elec-GBK160808T-221Y-N_C280479.pdf; ComponentLink2Description: JLCPCB Part URL; ComponentLink2URL: https://jlcpcb.com/partdetail/C280479; ComponentLink3Description: LCSC Part URL; ComponentLink3URL: https://lcsc.com/product-detail/Ferrite-Beads_Chilisin-Elec-Chilisin-Elec-GBK160808T-221Y-N_C280479.html
footprint FB-0603 (0603 (1608M) Ferrite)
pins: 1, 2

## GBK160808T-300Y-N
designator FB?  Impedance @ Frequency: 30Ω@100MHz
Ferrite, 30Ω@100MHz, ±25%, 0.06Ω, 800mA, SMD 0603; Manufacturer: Chilisin Elec; Manufacturer Part Number: GBK160808T-300Y-N; Package Size: 0603; JLCPCB Basic Part: No; JLCPCB Part Number: C285929; Supplier 1: LCSC; Category: Ferrite Beads; Supplier Part Number 1: C285929; Tolerance: ±25%; Rated Current: 800mA; DC Resistance: 0.06Ω; RoHS: Yes; ComponentLink1Description: Datasheet; ComponentLink1URL: https://wmsc.lcsc.com/wmsc/upload/file/pdf/v2/lcsc/2304140030_Chilisin-Elec-GBK160808T-300Y-N_C285929.pdf; ComponentLink2Description: JLCPCB Part URL; ComponentLink2URL: https://jlcpcb.com/partdetail/C285929; ComponentLink3Description: LCSC Part URL; ComponentLink3URL: https://lcsc.com/product-detail/Ferrite-Beads_Chilisin-Elec-Chilisin-Elec-GBK160808T-300Y-N_C285929.html
footprint FB-0603 (0603 (1608M) Ferrite)
pins: 1, 2

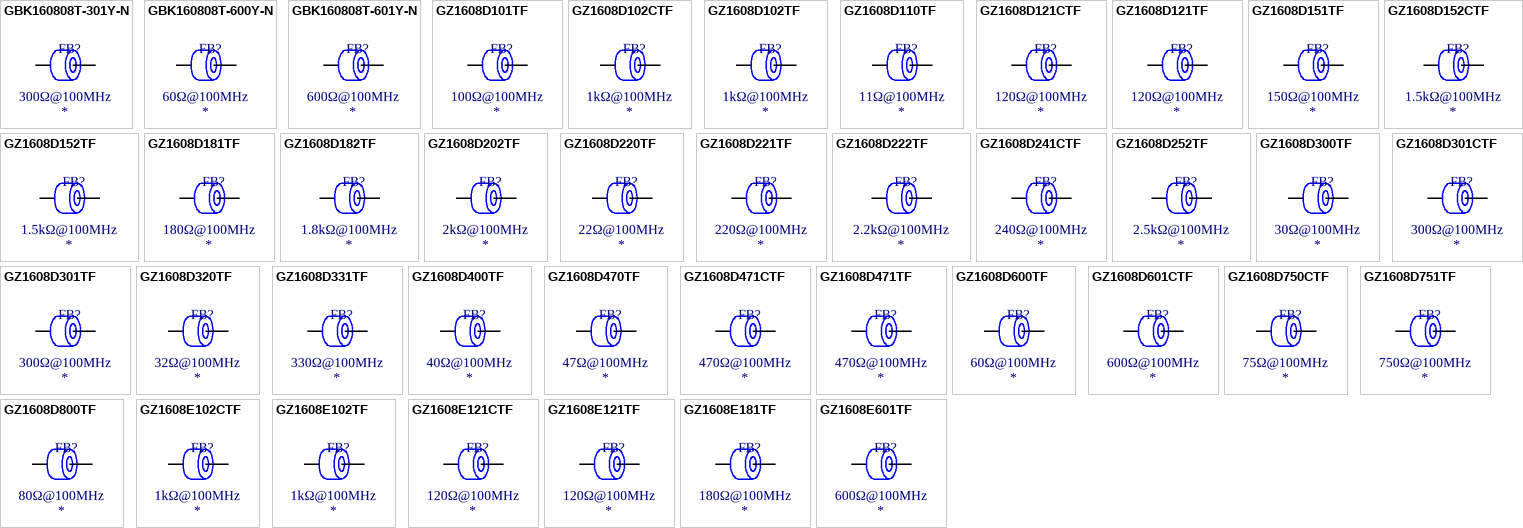
[diagram p10: symbols GBK160808T-301Y-N to GZ1608E601TF]

## GBK160808T-301Y-N
designator FB?  Impedance @ Frequency: 300Ω@100MHz
Ferrite, 300Ω@100MHz, ±25%, 0.25Ω, 500mA, SMD 0603; Manufacturer: Chilisin Elec; Manufacturer Part Number: GBK160808T-301Y-N; Package Size: 0603; JLCPCB Basic Part: No; JLCPCB Part Number: C285927; Supplier 1: LCSC; Category: Ferrite Beads; Supplier Part Number 1: C285927; Tolerance: ±25%; Rated Current: 500mA; DC Resistance: 0.25Ω; RoHS: Yes; ComponentLink1Description: Datasheet; ComponentLink1URL: https://wmsc.lcsc.com/wmsc/upload/file/pdf/v2/lcsc/2304140030_Chilisin-Elec-GBK160808T-301Y-N_C285927.pdf; ComponentLink2Description: JLCPCB Part URL; ComponentLink2URL: https://jlcpcb.com/partdetail/C285927; ComponentLink3Description: LCSC Part URL; ComponentLink3URL: https://lcsc.com/product-detail/Ferrite-Beads_Chilisin-Elec-Chilisin-Elec-GBK160808T-301Y-N_C285927.html
footprint FB-0603 (0603 (1608M) Ferrite)
pins: 1, 2

## GBK160808T-600Y-N
designator FB?  Impedance @ Frequency: 60Ω@100MHz
Ferrite, 60Ω@100MHz, ±25%, 0.06Ω, 700mA, SMD 0603; Manufacturer: Chilisin Elec; Manufacturer Part Number: GBK160808T-600Y-N; Package Size: 0603; JLCPCB Basic Part: No; JLCPCB Part Number: C285926; Supplier 1: LCSC; Category: Ferrite Beads; Supplier Part Number 1: C285926; Tolerance: ±25%; Rated Current: 700mA; DC Resistance: 0.06Ω; RoHS: Yes; ComponentLink1Description: Datasheet; ComponentLink1URL: https://wmsc.lcsc.com/wmsc/upload/file/pdf/v2/lcsc/2304140030_Chilisin-Elec-GBK160808T-600Y-N_C285926.pdf; ComponentLink2Description: JLCPCB Part URL; ComponentLink2URL: https://jlcpcb.com/partdetail/C285926; ComponentLink3Description: LCSC Part URL; ComponentLink3URL: https://lcsc.com/product-detail/Ferrite-Beads_Chilisin-Elec-Chilisin-Elec-GBK160808T-600Y-N_C285926.html
footprint FB-0603 (0603 (1608M) Ferrite)
pins: 1, 2

## GBK160808T-601Y-N
designator FB?  Impedance @ Frequency: 600Ω@100MHz
Ferrite, 600Ω@100MHz, ±25%, 0.3Ω, 400mA, SMD 0603; Manufacturer: Chilisin Elec; Manufacturer Part Number: GBK160808T-601Y-N; Package Size: 0603; JLCPCB Basic Part: No; JLCPCB Part Number: C285925; Supplier 1: LCSC; Category: Ferrite Beads; Supplier Part Number 1: C285925; Tolerance: ±25%; Rated Current: 400mA; DC Resistance: 0.3Ω; RoHS: Yes; ComponentLink1Description: Datasheet; ComponentLink1URL: https://wmsc.lcsc.com/wmsc/upload/file/pdf/v2/lcsc/2304140030_Chilisin-Elec-GBK160808T-601Y-N_C285925.pdf; ComponentLink2Description: JLCPCB Part URL; ComponentLink2URL: https://jlcpcb.com/partdetail/C285925; ComponentLink3Description: LCSC Part URL; ComponentLink3URL: https://lcsc.com/product-detail/Ferrite-Beads_Chilisin-Elec-Chilisin-Elec-GBK160808T-601Y-N_C285925.html
footprint FB-0603 (0603 (1608M) Ferrite)
pins: 1, 2

## GZ1608D101TF
designator FB?  Impedance @ Frequency: 100Ω@100MHz
Ferrite, 100Ω@100MHz, ±25%, 200mΩ, 300mA, SMD 0603; Manufacturer: Sunlord; Manufacturer Part Number: GZ1608D101TF; Package Size: 0603; JLCPCB Basic Part: No; JLCPCB Part Number: C74325; Supplier 1: LCSC; Category: Ferrite Beads; Supplier Part Number 1: C74325; Tolerance: ±25%; Rated Current: 300mA; DC Resistance: 200mΩ; RoHS: Yes; ComponentLink1Description: Datasheet; ComponentLink1URL: https://wmsc.lcsc.com/wmsc/upload/file/pdf/v2/lcsc/2310301640_Sunlord-GZ1608D101TF_C74325.pdf; ComponentLink2Description: JLCPCB Part URL; ComponentLink2URL: https://jlcpcb.com/partdetail/C74325; ComponentLink3Description: LCSC Part URL; ComponentLink3URL: https://lcsc.com/product-detail/Ferrite-Beads_Sunlord-Sunlord-GZ1608D101TF_C74325.html
footprint FB-0603 (0603 (1608M) Ferrite)
pins: 1, 2

## GZ1608D102CTF
designator FB?  Impedance @ Frequency: 1kΩ@100MHz
Ferrite, 1kΩ@100MHz, ±25%, 500mΩ, 400mA, SMD 0603; Manufacturer: Sunlord; Manufacturer Part Number: GZ1608D102CTF; Package Size: 0603; JLCPCB Basic Part: No; JLCPCB Part Number: C92622; Supplier 1: LCSC; Category: Ferrite Beads; Supplier Part Number 1: C92622; Tolerance: ±25%; Rated Current: 400mA; DC Resistance: 500mΩ; RoHS: Yes; ComponentLink1Description: Datasheet; ComponentLink1URL: https://wmsc.lcsc.com/wmsc/upload/file/pdf/v2/lcsc/2310301640_Sunlord-GZ1608D102CTF_C92622.pdf; ComponentLink2Description: JLCPCB Part URL; ComponentLink2URL: https://jlcpcb.com/partdetail/C92622; ComponentLink3Description: LCSC Part URL; ComponentLink3URL: https://lcsc.com/product-detail/Ferrite-Beads_Sunlord-Sunlord-GZ1608D102CTF_C92622.html
footprint FB-0603 (0603 (1608M) Ferrite)
pins: 1, 2

## GZ1608D102TF
designator FB?  Impedance @ Frequency: 1kΩ@100MHz
Ferrite, 1kΩ@100MHz, ±25%, 600mΩ, 200mA, SMD 0603; Manufacturer: Sunlord; Manufacturer Part Number: GZ1608D102TF; Package Size: 0603; JLCPCB Basic Part: No; JLCPCB Part Number: C35061; Supplier 1: LCSC; Category: Ferrite Beads; Supplier Part Number 1: C35061; Tolerance: ±25%; Rated Current: 200mA; DC Resistance: 600mΩ; RoHS: Yes; ComponentLink1Description: Datasheet; ComponentLink1URL: https://wmsc.lcsc.com/wmsc/upload/file/pdf/v2/lcsc/2310301640_Sunlord-GZ1608D102TF_C35061.pdf; ComponentLink2Description: JLCPCB Part URL; ComponentLink2URL: https://jlcpcb.com/partdetail/C35061; ComponentLink3Description: LCSC Part URL; ComponentLink3URL: https://lcsc.com/product-detail/Ferrite-Beads_Sunlord-Sunlord-GZ1608D102TF_C35061.html
footprint FB-0603 (0603 (1608M) Ferrite)
pins: 1, 2

## GZ1608D110TF
designator FB?  Impedance @ Frequency: 11Ω@100MHz
Ferrite, 11Ω@100MHz, 50mΩ, 2A, SMD 0603; Manufacturer: Sunlord; Manufacturer Part Number: GZ1608D110TF; Package Size: 0603; JLCPCB Basic Part: No; JLCPCB Part Number: C74329; Supplier 1: LCSC; Category: Ferrite Beads; Supplier Part Number 1: C74329; Rated Current: 2A; DC Resistance: 50mΩ; RoHS: Yes; ComponentLink1Description: Datasheet; ComponentLink1URL: https://wmsc.lcsc.com/wmsc/upload/file/pdf/v2/lcsc/2310301640_Sunlord-GZ1608D110TF_C74329.pdf; ComponentLink2Description: JLCPCB Part URL; ComponentLink2URL: https://jlcpcb.com/partdetail/C74329; ComponentLink3Description: LCSC Part URL; ComponentLink3URL: https://lcsc.com/product-detail/Ferrite-Beads_Sunlord-Sunlord-GZ1608D110TF_C74329.html
pins: 1, 2

## GZ1608D121CTF
designator FB?  Impedance @ Frequency: 120Ω@100MHz
Ferrite, 120Ω@100MHz, ±25%, 200mΩ, 500mA, SMD 0603; Manufacturer: Sunlord; Manufacturer Part Number: GZ1608D121CTF; Package Size: 0603; JLCPCB Basic Part: No; JLCPCB Part Number: C98270; Supplier 1: LCSC; Category: Ferrite Beads; Supplier Part Number 1: C98270; Tolerance: ±25%; Rated Current: 500mA; DC Resistance: 200mΩ; RoHS: Yes; ComponentLink1Description: Datasheet; ComponentLink1URL: https://wmsc.lcsc.com/wmsc/upload/file/pdf/v2/lcsc/2310301640_Sunlord-GZ1608D121CTF_C98270.pdf; ComponentLink2Description: JLCPCB Part URL; ComponentLink2URL: https://jlcpcb.com/partdetail/C98270; ComponentLink3Description: LCSC Part URL; ComponentLink3URL: https://lcsc.com/product-detail/Ferrite-Beads_Sunlord-Sunlord-GZ1608D121CTF_C98270.html
footprint FB-0603 (0603 (1608M) Ferrite)
pins: 1, 2

## GZ1608D121TF
designator FB?  Impedance @ Frequency: 120Ω@100MHz
Ferrite, 120Ω@100MHz, ±25%, 200mΩ, 300mA, SMD 0603; Manufacturer: Sunlord; Manufacturer Part Number: GZ1608D121TF; Package Size: 0603; JLCPCB Basic Part: No; JLCPCB Part Number: C12391; Supplier 1: LCSC; Category: Ferrite Beads; Supplier Part Number 1: C12391; Tolerance: ±25%; Rated Current: 300mA; DC Resistance: 200mΩ; RoHS: Yes; ComponentLink1Description: Datasheet; ComponentLink1URL: https://wmsc.lcsc.com/wmsc/upload/file/pdf/v2/lcsc/2310301640_Sunlord-GZ1608D121TF_C12391.pdf; ComponentLink2Description: JLCPCB Part URL; ComponentLink2URL: https://jlcpcb.com/partdetail/C12391; ComponentLink3Description: LCSC Part URL; ComponentLink3URL: https://lcsc.com/product-detail/Ferrite-Beads_Sunlord-Sunlord-GZ1608D121TF_C12391.html
footprint FB-0603 (0603 (1608M) Ferrite)
pins: 1, 2

## GZ1608D151TF
designator FB?  Impedance @ Frequency: 150Ω@100MHz
Ferrite, 150Ω@100MHz, ±25%, SMD 0603; Manufacturer: Sunlord; Manufacturer Part Number: GZ1608D151TF; Package Size: 0603; JLCPCB Basic Part: No; JLCPCB Part Number: C1003; Supplier 1: LCSC; Category: Ferrite Beads; Supplier Part Number 1: C1003; Tolerance: ±25%; RoHS: Yes; ComponentLink1Description: Datasheet; ComponentLink1URL: https://wmsc.lcsc.com/wmsc/upload/file/pdf/v2/lcsc/2310301640_Sunlord-GZ1608D151TF_C1003.pdf; ComponentLink2Description: JLCPCB Part URL; ComponentLink2URL: https://jlcpcb.com/partdetail/C1003; ComponentLink3Description: LCSC Part URL; ComponentLink3URL: https://lcsc.com/product-detail/Ferrite-Beads_Sunlord-Sunlord-GZ1608D151TF_C1003.html
pins: 1, 2

## GZ1608D152CTF
designator FB?  Impedance @ Frequency: 1.5kΩ@100MHz
Ferrite, 1.5kΩ@100MHz, ±25%, 600mΩ, 300mA, SMD 0603; Manufacturer: Sunlord; Manufacturer Part Number: GZ1608D152CTF; Package Size: 0603; JLCPCB Basic Part: No; JLCPCB Part Number: C96693; Supplier 1: LCSC; Category: Ferrite Beads; Supplier Part Number 1: C96693; Tolerance: ±25%; Rated Current: 300mA; DC Resistance: 600mΩ; RoHS: Yes; ComponentLink1Description: Datasheet; ComponentLink1URL: https://wmsc.lcsc.com/wmsc/upload/file/pdf/v2/lcsc/2310301640_Sunlord-GZ1608D152CTF_C96693.pdf; ComponentLink2Description: JLCPCB Part URL; ComponentLink2URL: https://jlcpcb.com/partdetail/C96693; ComponentLink3Description: LCSC Part URL; ComponentLink3URL: https://lcsc.com/product-detail/Ferrite-Beads_Sunlord-Sunlord-GZ1608D152CTF_C96693.html
footprint FB-0603 (0603 (1608M) Ferrite)
pins: 1, 2

## GZ1608D152TF
designator FB?  Impedance @ Frequency: 1.5kΩ@100MHz
Ferrite, 1.5kΩ@100MHz, ±25%, 700mΩ, 150mA, SMD 0603; Manufacturer: Sunlord; Manufacturer Part Number: GZ1608D152TF; Package Size: 0603; JLCPCB Basic Part: No; JLCPCB Part Number: C96694; Supplier 1: LCSC; Category: Ferrite Beads; Supplier Part Number 1: C96694; Tolerance: ±25%; Rated Current: 150mA; DC Resistance: 700mΩ; RoHS: Yes; ComponentLink1Description: Datasheet; ComponentLink1URL: https://wmsc.lcsc.com/wmsc/upload/file/pdf/v2/lcsc/2310301640_Sunlord-GZ1608D152TF_C96694.pdf; ComponentLink2Description: JLCPCB Part URL; ComponentLink2URL: https://jlcpcb.com/partdetail/C96694; ComponentLink3Description: LCSC Part URL; ComponentLink3URL: https://lcsc.com/product-detail/Ferrite-Beads_Sunlord-Sunlord-GZ1608D152TF_C96694.html
footprint FB-0603 (0603 (1608M) Ferrite)
pins: 1, 2

## GZ1608D181TF
designator FB?  Impedance @ Frequency: 180Ω@100MHz
Ferrite, 180Ω@100MHz, ±25%, SMD 0603; Manufacturer: Sunlord; Manufacturer Part Number: GZ1608D181TF; Package Size: 0603; JLCPCB Basic Part: No; JLCPCB Part Number: C15909; Supplier 1: LCSC; Category: Ferrite Beads; Supplier Part Number 1: C15909; Tolerance: ±25%; RoHS: Yes; ComponentLink1Description: Datasheet; ComponentLink1URL: https://wmsc.lcsc.com/wmsc/upload/file/pdf/v2/lcsc/2310301640_Sunlord-GZ1608D181TF_C15909.pdf; ComponentLink2Description: JLCPCB Part URL; ComponentLink2URL: https://jlcpcb.com/partdetail/C15909; ComponentLink3Description: LCSC Part URL; ComponentLink3URL: https://lcsc.com/product-detail/Ferrite-Beads_Sunlord-Sunlord-GZ1608D181TF_C15909.html
pins: 1, 2